# Altium integrated library RF Module.IntLib: 92 symbols (part 1 of 2) (continued)
## 10955 (continued)
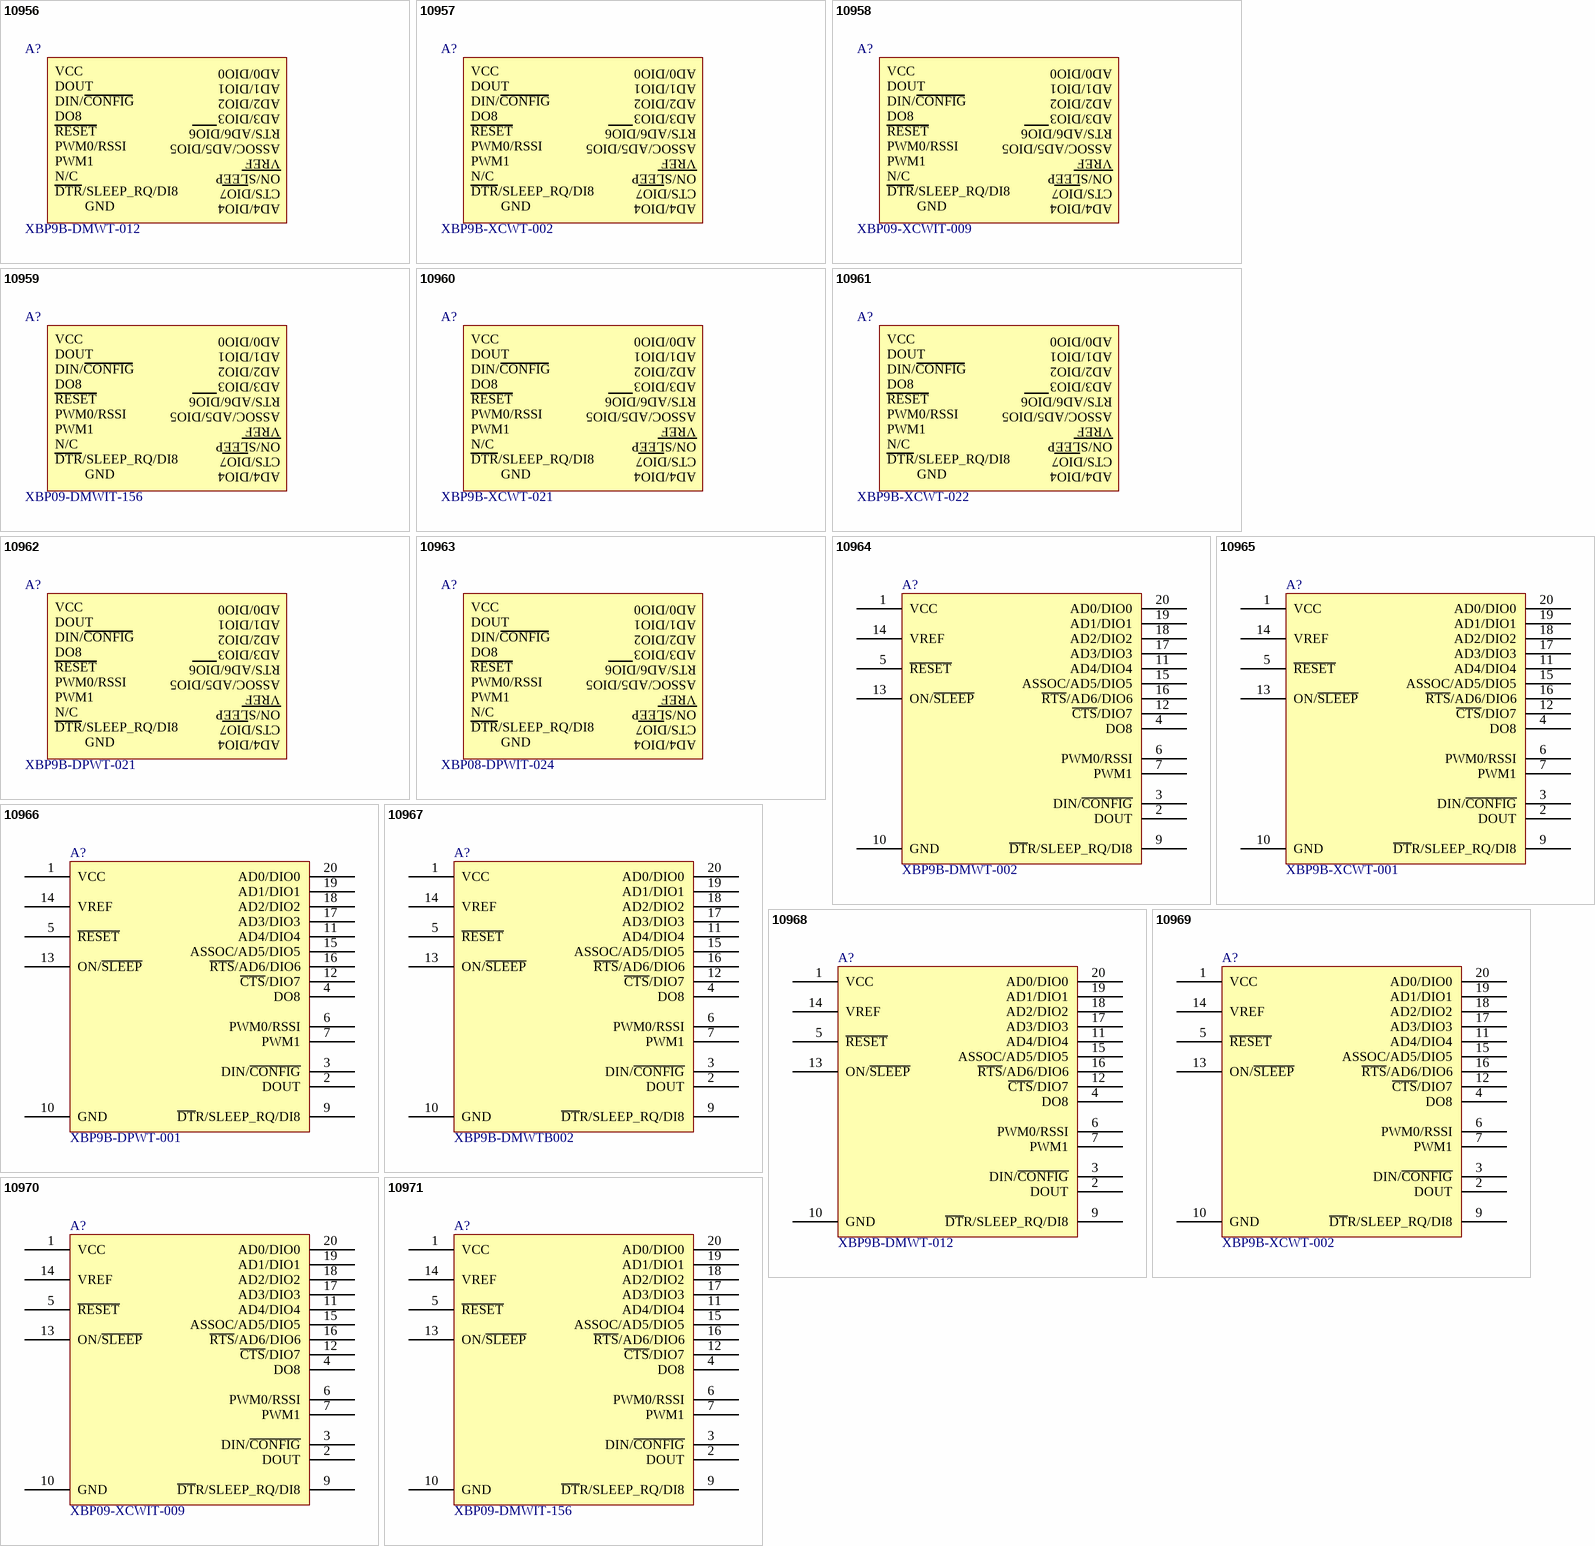
[diagram p4: symbols 10956 to 10971]
text: AD0/DIO0; VCC; AD1/DIO1; DOUT; AD2/DIO2; DIN/CONFIG; AD3/DIO3; DO8; RTS/AD6/DIO6; RESET; ASSOC/AD5/DIO5; PWM0/RSSI; VREF; PWM1; ON/SLEEP; N/C; CTS/DIO7; DTR/SLEEP_RQ/DI8; AD4/DIO4; GND

## 10956
designator A?, comment XBP9B-DMWT-012
XBEE PRO DIGIMESH S3B 900HP WIRE; Manufacturer: Digi International; RF Family/Standard: General ISM &lt; 1GHz; Modulation: FHSS; Frequency: 902MHz ~ 928MHz; DataRate: 200kbps; Power - Output: 24dBm; Sensitivity: -101dBm; Serial Interfaces: SPI, UART; Antenna Type: Integrated, Wire Antenna; Voltage - Supply: 2.1 V ~ 3.6 V; Current - Receiving: 29mA; Current - Transmitting: 215mA; PartId: 10956; Part Number: XBP9B-DMWT-012; Supplier 1: Digi-Key; Supplier Part Number 1: 602-1306-ND; ComponentLink1Description: Datasheet; ComponentLink1URL: http://www.digi.com/pdf/ds_xbeepro900hp.pdf; ComponentLink2Description: Digi-Key Listing; ComponentLink2URL: https://www.digikey.com/product-detail/en/digi-international/XBP9B-DMWT-012/602-1306-ND/3911192; Price: 54.41; Device Package: Module; Operating Temperature: -40C ~ 85C; Mounting Type: Through Hole
footprint DIGI XBEE PRO WIRE 900 FOR HDR
text: AD0/DIO0; VCC; AD1/DIO1; DOUT; AD2/DIO2; DIN/CONFIG; AD3/DIO3; DO8; RTS/AD6/DIO6; RESET; ASSOC/AD5/DIO5; PWM0/RSSI; VREF; PWM1; ON/SLEEP; N/C; CTS/DIO7; DTR/SLEEP_RQ/DI8; AD4/DIO4; GND

## 10957
designator A?, comment XBP9B-XCWT-002
XBEE PRO XSC S3B 900MHZ 250MW; Manufacturer: Digi International; RF Family/Standard: General ISM &lt; 1GHz; Modulation: FHSS; Frequency: 902MHz ~ 928MHz; DataRate: 20kbps; Power - Output: 24dBm; Sensitivity: -107dBm; Serial Interfaces: SPI, UART; Antenna Type: Integrated, Wire Antenna; Voltage - Supply: 2.4 V ~ 3.6 V; Current - Receiving: 26mA; Current - Transmitting: 215mA; PartId: 10957; Part Number: XBP9B-XCWT-002; Supplier 1: Digi-Key; Supplier Part Number 1: 602-1298-ND; ComponentLink1Description: Datasheet; ComponentLink1URL: http://www.digi.com/pdf/ds_xbeeproxsc.pdf; ComponentLink2Description: Digi-Key Listing; ComponentLink2URL: https://www.digikey.com/product-detail/en/digi-international/XBP9B-XCWT-002/602-1298-ND/3482825; Price: 54.41; Device Package: Module; Operating Temperature: -40C ~ 85C; Mounting Type: Through Hole
footprint DIGI XBEE PRO WIRE 900 FOR HDR
text: AD0/DIO0; VCC; AD1/DIO1; DOUT; AD2/DIO2; DIN/CONFIG; AD3/DIO3; DO8; RTS/AD6/DIO6; RESET; ASSOC/AD5/DIO5; PWM0/RSSI; VREF; PWM1; ON/SLEEP; N/C; CTS/DIO7; DTR/SLEEP_RQ/DI8; AD4/DIO4; GND

## 10958
designator A?, comment XBP09-XCWIT-009
XBEE-PRO XSC -100MW 9.6KBPS; Manufacturer: Digi International; RF Family/Standard: General ISM &lt; 1GHz; Modulation: FHSS; Frequency: 900MHz; DataRate: 10kbps; Power - Output: 20dBm; Sensitivity: -106dBm; Serial Interfaces: UART; Antenna Type: Integrated, Wire Antenna; Voltage - Supply: 3 V ~ 3.6 V; Current - Receiving: 65mA; Current - Transmitting: 265mA; PartId: 10958; Part Number: XBP09-XCWIT-009; Supplier 1: Digi-Key; Supplier Part Number 1: 602-1279-ND; ComponentLink1Description: Datasheet; ComponentLink1URL: http://www.digi.com/pdf/ds_xbeeproxsc.pdf; ComponentLink2Description: Digi-Key Listing; ComponentLink2URL: https://www.digikey.com/product-detail/en/digi-international/XBP09-XCWIT-009/602-1279-ND/3079625; Price: 54.41; Device Package: Module; Operating Temperature: -40C ~ 85C; Mounting Type: Through Hole
footprint DIGI XBEE PRO WIRE 900 FOR HDR
text: AD0/DIO0; VCC; AD1/DIO1; DOUT; AD2/DIO2; DIN/CONFIG; AD3/DIO3; DO8; RTS/AD6/DIO6; RESET; ASSOC/AD5/DIO5; PWM0/RSSI; VREF; PWM1; ON/SLEEP; N/C; CTS/DIO7; DTR/SLEEP_RQ/DI8; AD4/DIO4; GND

## 10959
designator A?, comment XBP09-DMWIT-156
XBEE PRO DIGIMESH 900MHZ WIRE; Manufacturer: Digi International; Protocol: Zigbee; DataRate: 156kbps; Power - Output: 17dBm; Sensitivity: -100dBm; Antenna Type: Integrated, Wire Antenna; Voltage - Supply: 3 V ~ 3.6 V; Current - Receiving: 80mA; Current - Transmitting: 210mA; PartId: 10959; Part Number: XBP09-DMWIT-156; Supplier 1: Digi-Key; Supplier Part Number 1: 602-1277-ND; ComponentLink1Description: Datasheet; ComponentLink1URL: http://ftp1.digi.com/support/documentation/90000903_G.pdf; ComponentLink2Description: Digi-Key Listing; ComponentLink2URL: https://www.digikey.com/product-detail/en/digi-international/XBP09-DMWIT-156/602-1277-ND/3482661; Price: 54.41; Device Package: Module; Operating Temperature: -40C ~ 85C; RF Family/Standard: 802.15.4; Frequency: 900MHz; Mounting Type: Through Hole
footprint DIGI XBEE PRO WIRE 900 FOR HDR
text: AD0/DIO0; VCC; AD1/DIO1; DOUT; AD2/DIO2; DIN/CONFIG; AD3/DIO3; DO8; RTS/AD6/DIO6; RESET; ASSOC/AD5/DIO5; PWM0/RSSI; VREF; PWM1; ON/SLEEP; N/C; CTS/DIO7; DTR/SLEEP_RQ/DI8; AD4/DIO4; GND

## 10960
designator A?, comment XBP9B-XCWT-021
XBEE PRO XSC S3B 900MHZ 250MW; Manufacturer: Digi International; RF Family/Standard: General ISM &lt; 1GHz; Modulation: FHSS; Frequency: 902MHz ~ 928MHz; DataRate: 10kbps; Power - Output: 24dBm; Sensitivity: -109dBm; Serial Interfaces: SPI, UART; Antenna Type: Integrated, Wire Antenna; Voltage - Supply: 2.4 V ~ 3.6 V; Current - Receiving: 26mA; Current - Transmitting: 215mA; PartId: 10960; Part Number: XBP9B-XCWT-021; Supplier 1: Digi-Key; Supplier Part Number 1: 602-1356-ND; ComponentLink1Description: Datasheet; ComponentLink1URL: http://www.digi.com/pdf/ds_xbeeproxsc.pdf; ComponentLink2Description: Digi-Key Listing; ComponentLink2URL: https://www.digikey.com/product-detail/en/digi-international/XBP9B-XCWT-021/602-1356-ND/3482826; Price: 54.41; Device Package: Module; Operating Temperature: -40C ~ 85C; Mounting Type: Through Hole
footprint DIGI XBEE PRO WIRE 900 FOR HDR
text: AD0/DIO0; VCC; AD1/DIO1; DOUT; AD2/DIO2; DIN/CONFIG; AD3/DIO3; DO8; RTS/AD6/DIO6; RESET; ASSOC/AD5/DIO5; PWM0/RSSI; VREF; PWM1; ON/SLEEP; N/C; CTS/DIO7; DTR/SLEEP_RQ/DI8; AD4/DIO4; GND

## 10961
designator A?, comment XBP9B-XCWT-022
XBEE PRO XSC S3B 900MHZ 250MW; Manufacturer: Digi International; RF Family/Standard: General ISM &lt; 1GHz; Modulation: FHSS; Frequency: 902MHz ~ 928MHz; DataRate: 10kbps; Power - Output: 24dBm; Sensitivity: -107dBm; Serial Interfaces: SPI, UART; Antenna Type: Integrated, Wire Antenna; Voltage - Supply: 2.4 V ~ 3.6 V; Current - Receiving: 26mA; Current - Transmitting: 215mA; PartId: 10961; Part Number: XBP9B-XCWT-022; Supplier 1: Digi-Key; Supplier Part Number 1: 602-1357-ND; ComponentLink1Description: Datasheet; ComponentLink1URL: http://www.digi.com/pdf/ds_xbeeproxsc.pdf; ComponentLink2Description: Digi-Key Listing; ComponentLink2URL: https://www.digikey.com/product-detail/en/digi-international/XBP9B-XCWT-022/602-1357-ND/3482827; Price: 54.41; Device Package: Module; Operating Temperature: -40C ~ 85C; Mounting Type: Through Hole
footprint DIGI XBEE PRO WIRE 900 FOR HDR
text: AD0/DIO0; VCC; AD1/DIO1; DOUT; AD2/DIO2; DIN/CONFIG; AD3/DIO3; DO8; RTS/AD6/DIO6; RESET; ASSOC/AD5/DIO5; PWM0/RSSI; VREF; PWM1; ON/SLEEP; N/C; CTS/DIO7; DTR/SLEEP_RQ/DI8; AD4/DIO4; GND

## 10962
designator A?, comment XBP9B-DPWT-021
XBEE PRO WIRE ANT 250MW 10KBPS; Manufacturer: Digi International; RF Family/Standard: General ISM &lt; 1GHz; Modulation: FHSS; Frequency: 902MHz ~ 928MHz; Power - Output: 24dBm; Sensitivity: -110dBm; Serial Interfaces: SPI, UART; Antenna Type: Integrated, Wire Antenna; Voltage - Supply: 2.1 V ~ 3.6 V; Current - Receiving: 29mA; Current - Transmitting: 215mA; PartId: 10962; Part Number: XBP9B-DPWT-021; Supplier 1: Digi-Key; Supplier Part Number 1: 602-1489-ND; ComponentLink1Description: Datasheet; ComponentLink1URL: http://www.digi.com/pdf/ds_xbeepro900hp.pdf; ComponentLink2Description: Digi-Key Listing; ComponentLink2URL: https://www.digikey.com/product-detail/en/digi-international/XBP9B-DPWT-021/602-1489-ND/3728687; Price: 54.41; Device Package: Module; Operating Temperature: -40C ~ 85C; DataRate: 10kbps; Mounting Type: Through Hole
footprint DIGI XBEE PRO WIRE 900 FOR HDR
text: AD0/DIO0; VCC; AD1/DIO1; DOUT; AD2/DIO2; DIN/CONFIG; AD3/DIO3; DO8; RTS/AD6/DIO6; RESET; ASSOC/AD5/DIO5; PWM0/RSSI; VREF; PWM1; ON/SLEEP; N/C; CTS/DIO7; DTR/SLEEP_RQ/DI8; AD4/DIO4; GND

## 10963
designator A?, comment XBP08-DPWIT-024
XBEE PRO 868MHZ 1-315MW WIRE EU; Manufacturer: Digi International; Protocol: Zigbee; DataRate: 24kbps; Power - Output: 25dBm; Sensitivity: -112dBm; Antenna Type: Integrated, Wire Antenna; Voltage - Supply: 3 V ~ 3.6 V; Current - Receiving: 65mA; Current - Transmitting: 500mA; PartId: 10963; Part Number: XBP08-DPWIT-024; Supplier 1: Digi-Key; Supplier Part Number 1: 602-1475-ND; ComponentLink1Description: Datasheet; ComponentLink1URL: http://www.digi.com/pdf/ds_xbeepro868.pdf; ComponentLink2Description: Digi-Key Listing; ComponentLink2URL: https://www.digikey.com/product-detail/en/digi-international/XBP08-DPWIT-024/602-1475-ND/3482658; Price: 62.78; Device Package: Module; Operating Temperature: -40C ~ 85C; RF Family/Standard: 802.15.4; Frequency: 868MHz; Mounting Type: Through Hole
footprint DIGI XBEE PRO WIRE 900 FOR HDR
text: AD0/DIO0; VCC; AD1/DIO1; DOUT; AD2/DIO2; DIN/CONFIG; AD3/DIO3; DO8; RTS/AD6/DIO6; RESET; ASSOC/AD5/DIO5; PWM0/RSSI; VREF; PWM1; ON/SLEEP; N/C; CTS/DIO7; DTR/SLEEP_RQ/DI8; AD4/DIO4; GND

## 10964
designator A?, comment XBP9B-DMWT-002
MODULE XBEE PRO S3B 900HP WR ANT; Manufacturer: Digi International; RF Family/Standard: General ISM &lt; 1GHz; Modulation: FHSS; Frequency: 900MHz; DataRate: 200kbps; Power - Output: 24dBm; Sensitivity: -101dBm; Serial Interfaces: SPI, UART; Antenna Type: Integrated, Wire Antenna; Voltage - Supply: 2.1 V ~ 3.6 V; Current - Receiving: 29mA; Current - Transmitting: 215mA; PartId: 10964; Part Number: XBP9B-DMWT-002; Supplier 1: Digi-Key; Supplier Part Number 1: 602-1301-ND; ComponentLink1Description: Datasheet; ComponentLink1URL: http://www.digi.com/pdf/ds_xbeepro900hp.pdf; ComponentLink2Description: Digi-Key Listing; ComponentLink2URL: https://www.digikey.com/product-detail/en/digi-international/XBP9B-DMWT-002/602-1301-ND/3594159; Price: 54.41; Device Package: Module; Operating Temperature: -40C ~ 85C; Mounting Type: Through Hole
footprint DIGI XBEE PRO WIRE 900
pins: 1 VCC, 2 DOUT, 3 DIN/~{CONFIG}, 4 DO8, 5 ~{RESET}, 6 PWM0/RSSI, 7 PWM1, 9 ~{DT}R/SLEEP_RQ/DI8, 10 GND, 11 AD4/DIO4, 12 ~{CTS}/DIO7, 13 ON/~{SLEEP}, 14 VREF, 15 ASSOC/AD5/DIO5, 16 ~{RTS}/AD6/DIO6, 17 AD3/DIO3, 18 AD2/DIO2, 19 AD1/DIO1, 20 AD0/DIO0

## 10965
designator A?, comment XBP9B-XCWT-001
XBEE PRO XSC S3B 900MHZ 250MW; Manufacturer: Digi International; RF Family/Standard: General ISM &lt; 1GHz; Modulation: FHSS; Frequency: 902MHz ~ 928MHz; DataRate: 10kbps; Power - Output: 24dBm; Sensitivity: -109dBm; Serial Interfaces: SPI, UART; Antenna Type: Integrated, Wire Antenna; Voltage - Supply: 2.4 V ~ 3.6 V; Current - Receiving: 26mA; Current - Transmitting: 215mA; PartId: 10965; Part Number: XBP9B-XCWT-001; Supplier 1: Digi-Key; Supplier Part Number 1: 602-1297-ND; ComponentLink1Description: Datasheet; ComponentLink1URL: http://www.digi.com/pdf/ds_xbeeproxsc.pdf; ComponentLink2Description: Digi-Key Listing; ComponentLink2URL: https://www.digikey.com/product-detail/en/digi-international/XBP9B-XCWT-001/602-1297-ND/3482824; Price: 54.41; Device Package: Module; Operating Temperature: -40C ~ 85C; Mounting Type: Through Hole
footprint DIGI XBEE PRO WIRE 900
pins: 1 VCC, 2 DOUT, 3 DIN/~{CONFIG}, 4 DO8, 5 ~{RESET}, 6 PWM0/RSSI, 7 PWM1, 9 ~{DT}R/SLEEP_RQ/DI8, 10 GND, 11 AD4/DIO4, 12 ~{CTS}/DIO7, 13 ON/~{SLEEP}, 14 VREF, 15 ASSOC/AD5/DIO5, 16 ~{RTS}/AD6/DIO6, 17 AD3/DIO3, 18 AD2/DIO2, 19 AD1/DIO1, 20 AD0/DIO0

## 10966
designator A?, comment XBP9B-DPWT-001
MODULE XBEE PRO S3B 900HP WR ANT; Manufacturer: Digi International; RF Family/Standard: General ISM &lt; 1GHz; Modulation: FHSS; Frequency: 902MHz ~ 928MHz; DataRate: 10kbps; Power - Output: 24dBm; Sensitivity: -110dBm; Serial Interfaces: SPI, UART; Antenna Type: Integrated, Wire Antenna; Voltage - Supply: 2.1 V ~ 3.6 V; Current - Receiving: 29mA; Current - Transmitting: 215mA; PartId: 10966; Part Number: XBP9B-DPWT-001; Supplier 1: Digi-Key; Supplier Part Number 1: 602-1351-ND; ComponentLink1Description: Datasheet; ComponentLink1URL: http://www.digi.com/pdf/ds_xbeepro900hp.pdf; ComponentLink2Description: Digi-Key Listing; ComponentLink2URL: https://www.digikey.com/product-detail/en/digi-international/XBP9B-DPWT-001/602-1351-ND/3594162; Price: 54.41; Device Package: Module; Operating Temperature: -40C ~ 85C; Mounting Type: Through Hole
footprint DIGI XBEE PRO WIRE 900
pins: 1 VCC, 2 DOUT, 3 DIN/~{CONFIG}, 4 DO8, 5 ~{RESET}, 6 PWM0/RSSI, 7 PWM1, 9 ~{DT}R/SLEEP_RQ/DI8, 10 GND, 11 AD4/DIO4, 12 ~{CTS}/DIO7, 13 ON/~{SLEEP}, 14 VREF, 15 ASSOC/AD5/DIO5, 16 ~{RTS}/AD6/DIO6, 17 AD3/DIO3, 18 AD2/DIO2, 19 AD1/DIO1, 20 AD0/DIO0

## 10967
designator A?, comment XBP9B-DMWTB002
XBEE PRO DIGIMESH S3B 900HP WIRE; Manufacturer: Digi International; RF Family/Standard: General ISM &lt; 1GHz; Modulation: FHSS; Frequency: 900MHz; DataRate: 200kbps; Power - Output: 24dBm; Sensitivity: -101dBm; Serial Interfaces: SPI, UART; Antenna Type: Integrated, Wire Antenna; Memory Size: 32kB Flash, 2kB RAM; Voltage - Supply: 2.1 V ~ 3.6 V; Current - Receiving: 29mA; Current - Transmitting: 215mA; PartId: 10967; Part Number: XBP9B-DMWTB002; Supplier 1: Digi-Key; Supplier Part Number 1: 602-1348-ND; ComponentLink1Description: Datasheet; ComponentLink1URL: http://www.digi.com/pdf/ds_xbeepro900hp.pdf; ComponentLink2Description: Digi-Key Listing; ComponentLink2URL: https://www.digikey.com/product-detail/en/digi-international/XBP9B-DMWTB002/602-1348-ND/3863552; Price: 58.25; Device Package: Module; Operating Temperature: -40C ~ 85C; Mounting Type: Through Hole
footprint DIGI XBEE PRO WIRE 900
pins: 1 VCC, 2 DOUT, 3 DIN/~{CONFIG}, 4 DO8, 5 ~{RESET}, 6 PWM0/RSSI, 7 PWM1, 9 ~{DT}R/SLEEP_RQ/DI8, 10 GND, 11 AD4/DIO4, 12 ~{CTS}/DIO7, 13 ON/~{SLEEP}, 14 VREF, 15 ASSOC/AD5/DIO5, 16 ~{RTS}/AD6/DIO6, 17 AD3/DIO3, 18 AD2/DIO2, 19 AD1/DIO1, 20 AD0/DIO0

## 10968
designator A?, comment XBP9B-DMWT-012
XBEE PRO DIGIMESH S3B 900HP WIRE; Manufacturer: Digi International; RF Family/Standard: General ISM &lt; 1GHz; Modulation: FHSS; Frequency: 902MHz ~ 928MHz; DataRate: 200kbps; Power - Output: 24dBm; Sensitivity: -101dBm; Serial Interfaces: SPI, UART; Antenna Type: Integrated, Wire Antenna; Voltage - Supply: 2.1 V ~ 3.6 V; Current - Receiving: 29mA; Current - Transmitting: 215mA; PartId: 10968; Part Number: XBP9B-DMWT-012; Supplier 1: Digi-Key; Supplier Part Number 1: 602-1306-ND; ComponentLink1Description: Datasheet; ComponentLink1URL: http://www.digi.com/pdf/ds_xbeepro900hp.pdf; ComponentLink2Description: Digi-Key Listing; ComponentLink2URL: https://www.digikey.com/product-detail/en/digi-international/XBP9B-DMWT-012/602-1306-ND/3911192; Price: 54.41; Device Package: Module; Operating Temperature: -40C ~ 85C; Mounting Type: Through Hole
footprint DIGI XBEE PRO WIRE 900
pins: 1 VCC, 2 DOUT, 3 DIN/~{CONFIG}, 4 DO8, 5 ~{RESET}, 6 PWM0/RSSI, 7 PWM1, 9 ~{DT}R/SLEEP_RQ/DI8, 10 GND, 11 AD4/DIO4, 12 ~{CTS}/DIO7, 13 ON/~{SLEEP}, 14 VREF, 15 ASSOC/AD5/DIO5, 16 ~{RTS}/AD6/DIO6, 17 AD3/DIO3, 18 AD2/DIO2, 19 AD1/DIO1, 20 AD0/DIO0

## 10969
designator A?, comment XBP9B-XCWT-002
XBEE PRO XSC S3B 900MHZ 250MW; Manufacturer: Digi International; RF Family/Standard: General ISM &lt; 1GHz; Modulation: FHSS; Frequency: 902MHz ~ 928MHz; DataRate: 20kbps; Power - Output: 24dBm; Sensitivity: -107dBm; Serial Interfaces: SPI, UART; Antenna Type: Integrated, Wire Antenna; Voltage - Supply: 2.4 V ~ 3.6 V; Current - Receiving: 26mA; Current - Transmitting: 215mA; PartId: 10969; Part Number: XBP9B-XCWT-002; Supplier 1: Digi-Key; Supplier Part Number 1: 602-1298-ND; ComponentLink1Description: Datasheet; ComponentLink1URL: http://www.digi.com/pdf/ds_xbeeproxsc.pdf; ComponentLink2Description: Digi-Key Listing; ComponentLink2URL: https://www.digikey.com/product-detail/en/digi-international/XBP9B-XCWT-002/602-1298-ND/3482825; Price: 54.41; Device Package: Module; Operating Temperature: -40C ~ 85C; Mounting Type: Through Hole
footprint DIGI XBEE PRO WIRE 900
pins: 1 VCC, 2 DOUT, 3 DIN/~{CONFIG}, 4 DO8, 5 ~{RESET}, 6 PWM0/RSSI, 7 PWM1, 9 ~{DT}R/SLEEP_RQ/DI8, 10 GND, 11 AD4/DIO4, 12 ~{CTS}/DIO7, 13 ON/~{SLEEP}, 14 VREF, 15 ASSOC/AD5/DIO5, 16 ~{RTS}/AD6/DIO6, 17 AD3/DIO3, 18 AD2/DIO2, 19 AD1/DIO1, 20 AD0/DIO0

## 10970
designator A?, comment XBP09-XCWIT-009
XBEE-PRO XSC -100MW 9.6KBPS; Manufacturer: Digi International; RF Family/Standard: General ISM &lt; 1GHz; Modulation: FHSS; Frequency: 900MHz; DataRate: 10kbps; Power - Output: 20dBm; Sensitivity: -106dBm; Serial Interfaces: UART; Antenna Type: Integrated, Wire Antenna; Voltage - Supply: 3 V ~ 3.6 V; Current - Receiving: 65mA; Current - Transmitting: 265mA; PartId: 10970; Part Number: XBP09-XCWIT-009; Supplier 1: Digi-Key; Supplier Part Number 1: 602-1279-ND; ComponentLink1Description: Datasheet; ComponentLink1URL: http://www.digi.com/pdf/ds_xbeeproxsc.pdf; ComponentLink2Description: Digi-Key Listing; ComponentLink2URL: https://www.digikey.com/product-detail/en/digi-international/XBP09-XCWIT-009/602-1279-ND/3079625; Price: 54.41; Device Package: Module; Operating Temperature: -40C ~ 85C; Mounting Type: Through Hole
footprint DIGI XBEE PRO WIRE 900
pins: 1 VCC, 2 DOUT, 3 DIN/~{CONFIG}, 4 DO8, 5 ~{RESET}, 6 PWM0/RSSI, 7 PWM1, 9 ~{DT}R/SLEEP_RQ/DI8, 10 GND, 11 AD4/DIO4, 12 ~{CTS}/DIO7, 13 ON/~{SLEEP}, 14 VREF, 15 ASSOC/AD5/DIO5, 16 ~{RTS}/AD6/DIO6, 17 AD3/DIO3, 18 AD2/DIO2, 19 AD1/DIO1, 20 AD0/DIO0

## 10971
designator A?, comment XBP09-DMWIT-156
XBEE PRO DIGIMESH 900MHZ WIRE; Manufacturer: Digi International; Protocol: Zigbee; DataRate: 156kbps; Power - Output: 17dBm; Sensitivity: -100dBm; Antenna Type: Integrated, Wire Antenna; Voltage - Supply: 3 V ~ 3.6 V; Current - Receiving: 80mA; Current - Transmitting: 210mA; PartId: 10971; Part Number: XBP09-DMWIT-156; Supplier 1: Digi-Key; Supplier Part Number 1: 602-1277-ND; ComponentLink1Description: Datasheet; ComponentLink1URL: http://ftp1.digi.com/support/documentation/90000903_G.pdf; ComponentLink2Description: Digi-Key Listing; ComponentLink2URL: https://www.digikey.com/product-detail/en/digi-international/XBP09-DMWIT-156/602-1277-ND/3482661; Price: 54.41; Device Package: Module; Operating Temperature: -40C ~ 85C; RF Family/Standard: 802.15.4; Frequency: 900MHz; Mounting Type: Through Hole
footprint DIGI XBEE PRO WIRE 900
pins: 1 VCC, 2 DOUT, 3 DIN/~{CONFIG}, 4 DO8, 5 ~{RESET}, 6 PWM0/RSSI, 7 PWM1, 9 ~{DT}R/SLEEP_RQ/DI8, 10 GND, 11 AD4/DIO4, 12 ~{CTS}/DIO7, 13 ON/~{SLEEP}, 14 VREF, 15 ASSOC/AD5/DIO5, 16 ~{RTS}/AD6/DIO6, 17 AD3/DIO3, 18 AD2/DIO2, 19 AD1/DIO1, 20 AD0/DIO0

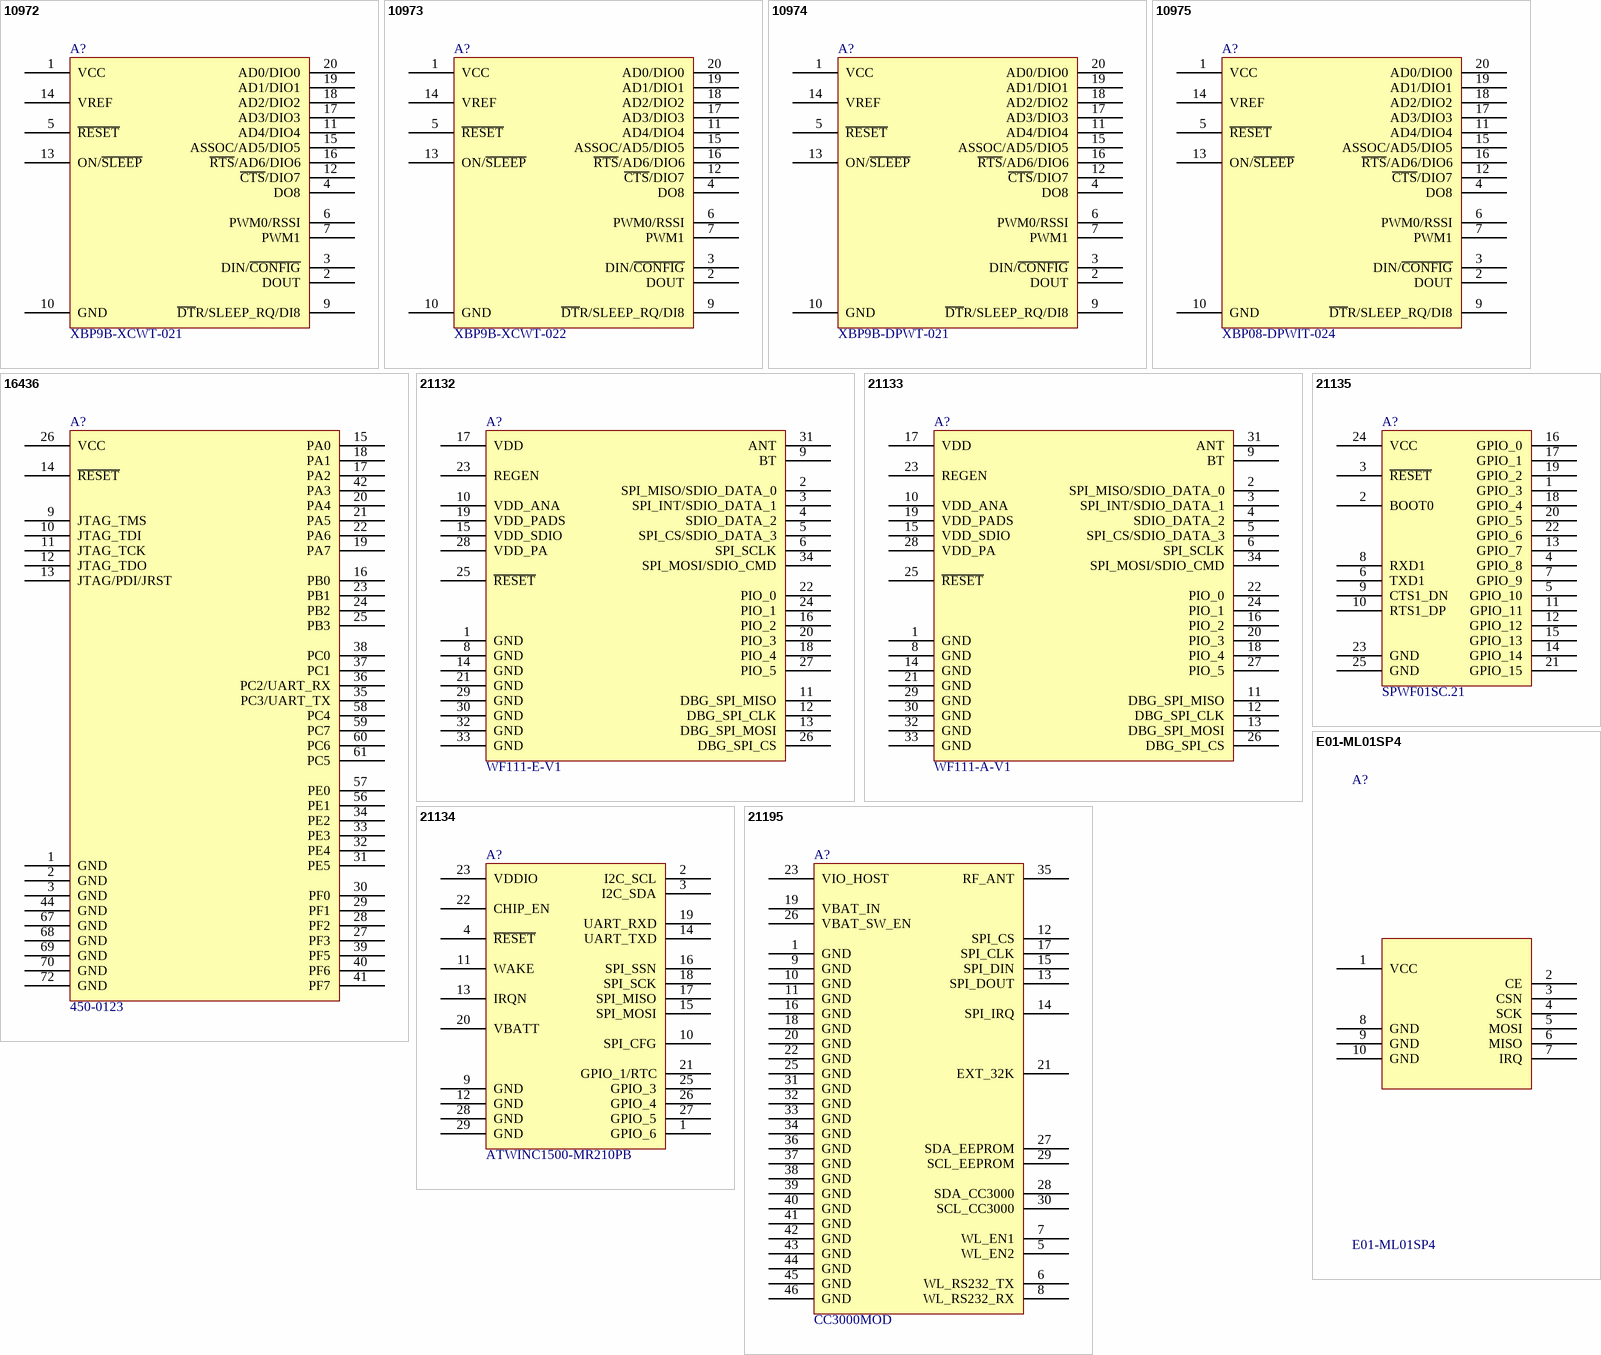
[diagram p5: symbols 10972 to E01-ML01SP4]

## 10972
designator A?, comment XBP9B-XCWT-021
XBEE PRO XSC S3B 900MHZ 250MW; Manufacturer: Digi International; RF Family/Standard: General ISM &lt; 1GHz; Modulation: FHSS; Frequency: 902MHz ~ 928MHz; DataRate: 10kbps; Power - Output: 24dBm; Sensitivity: -109dBm; Serial Interfaces: SPI, UART; Antenna Type: Integrated, Wire Antenna; Voltage - Supply: 2.4 V ~ 3.6 V; Current - Receiving: 26mA; Current - Transmitting: 215mA; PartId: 10972; Part Number: XBP9B-XCWT-021; Supplier 1: Digi-Key; Supplier Part Number 1: 602-1356-ND; ComponentLink1Description: Datasheet; ComponentLink1URL: http://www.digi.com/pdf/ds_xbeeproxsc.pdf; ComponentLink2Description: Digi-Key Listing; ComponentLink2URL: https://www.digikey.com/product-detail/en/digi-international/XBP9B-XCWT-021/602-1356-ND/3482826; Price: 54.41; Device Package: Module; Operating Temperature: -40C ~ 85C; Mounting Type: Through Hole
footprint DIGI XBEE PRO WIRE 900
pins: 1 VCC, 2 DOUT, 3 DIN/~{CONFIG}, 4 DO8, 5 ~{RESET}, 6 PWM0/RSSI, 7 PWM1, 9 ~{DT}R/SLEEP_RQ/DI8, 10 GND, 11 AD4/DIO4, 12 ~{CTS}/DIO7, 13 ON/~{SLEEP}, 14 VREF, 15 ASSOC/AD5/DIO5, 16 ~{RTS}/AD6/DIO6, 17 AD3/DIO3, 18 AD2/DIO2, 19 AD1/DIO1, 20 AD0/DIO0

## 10973
designator A?, comment XBP9B-XCWT-022
XBEE PRO XSC S3B 900MHZ 250MW; Manufacturer: Digi International; RF Family/Standard: General ISM &lt; 1GHz; Modulation: FHSS; Frequency: 902MHz ~ 928MHz; DataRate: 10kbps; Power - Output: 24dBm; Sensitivity: -107dBm; Serial Interfaces: SPI, UART; Antenna Type: Integrated, Wire Antenna; Voltage - Supply: 2.4 V ~ 3.6 V; Current - Receiving: 26mA; Current - Transmitting: 215mA; PartId: 10973; Part Number: XBP9B-XCWT-022; Supplier 1: Digi-Key; Supplier Part Number 1: 602-1357-ND; ComponentLink1Description: Datasheet; ComponentLink1URL: http://www.digi.com/pdf/ds_xbeeproxsc.pdf; ComponentLink2Description: Digi-Key Listing; ComponentLink2URL: https://www.digikey.com/product-detail/en/digi-international/XBP9B-XCWT-022/602-1357-ND/3482827; Price: 54.41; Device Package: Module; Operating Temperature: -40C ~ 85C; Mounting Type: Through Hole
footprint DIGI XBEE PRO WIRE 900
pins: 1 VCC, 2 DOUT, 3 DIN/~{CONFIG}, 4 DO8, 5 ~{RESET}, 6 PWM0/RSSI, 7 PWM1, 9 ~{DT}R/SLEEP_RQ/DI8, 10 GND, 11 AD4/DIO4, 12 ~{CTS}/DIO7, 13 ON/~{SLEEP}, 14 VREF, 15 ASSOC/AD5/DIO5, 16 ~{RTS}/AD6/DIO6, 17 AD3/DIO3, 18 AD2/DIO2, 19 AD1/DIO1, 20 AD0/DIO0

## 10974
designator A?, comment XBP9B-DPWT-021
XBEE PRO WIRE ANT 250MW 10KBPS; Manufacturer: Digi International; RF Family/Standard: General ISM &lt; 1GHz; Modulation: FHSS; Frequency: 902MHz ~ 928MHz; Power - Output: 24dBm; Sensitivity: -110dBm; Serial Interfaces: SPI, UART; Antenna Type: Integrated, Wire Antenna; Voltage - Supply: 2.1 V ~ 3.6 V; Current - Receiving: 29mA; Current - Transmitting: 215mA; PartId: 10974; Part Number: XBP9B-DPWT-021; Supplier 1: Digi-Key; Supplier Part Number 1: 602-1489-ND; ComponentLink1Description: Datasheet; ComponentLink1URL: http://www.digi.com/pdf/ds_xbeepro900hp.pdf; ComponentLink2Description: Digi-Key Listing; ComponentLink2URL: https://www.digikey.com/product-detail/en/digi-international/XBP9B-DPWT-021/602-1489-ND/3728687; Price: 54.41; Device Package: Module; Operating Temperature: -40C ~ 85C; DataRate: 10kbps; Mounting Type: Through Hole
footprint DIGI XBEE PRO WIRE 900
pins: 1 VCC, 2 DOUT, 3 DIN/~{CONFIG}, 4 DO8, 5 ~{RESET}, 6 PWM0/RSSI, 7 PWM1, 9 ~{DT}R/SLEEP_RQ/DI8, 10 GND, 11 AD4/DIO4, 12 ~{CTS}/DIO7, 13 ON/~{SLEEP}, 14 VREF, 15 ASSOC/AD5/DIO5, 16 ~{RTS}/AD6/DIO6, 17 AD3/DIO3, 18 AD2/DIO2, 19 AD1/DIO1, 20 AD0/DIO0

## 10975
designator A?, comment XBP08-DPWIT-024
XBEE PRO 868MHZ 1-315MW WIRE EU; Manufacturer: Digi International; Protocol: Zigbee; DataRate: 24kbps; Power - Output: 25dBm; Sensitivity: -112dBm; Antenna Type: Integrated, Wire Antenna; Voltage - Supply: 3 V ~ 3.6 V; Current - Receiving: 65mA; Current - Transmitting: 500mA; PartId: 10975; Part Number: XBP08-DPWIT-024; Supplier 1: Digi-Key; Supplier Part Number 1: 602-1475-ND; ComponentLink1Description: Datasheet; ComponentLink1URL: http://www.digi.com/pdf/ds_xbeepro868.pdf; ComponentLink2Description: Digi-Key Listing; ComponentLink2URL: https://www.digikey.com/product-detail/en/digi-international/XBP08-DPWIT-024/602-1475-ND/3482658; Price: 62.78; Device Package: Module; Operating Temperature: -40C ~ 85C; RF Family/Standard: 802.15.4; Frequency: 868MHz; Mounting Type: Through Hole
footprint DIGI XBEE PRO WIRE 900
pins: 1 VCC, 2 DOUT, 3 DIN/~{CONFIG}, 4 DO8, 5 ~{RESET}, 6 PWM0/RSSI, 7 PWM1, 9 ~{DT}R/SLEEP_RQ/DI8, 10 GND, 11 AD4/DIO4, 12 ~{CTS}/DIO7, 13 ON/~{SLEEP}, 14 VREF, 15 ASSOC/AD5/DIO5, 16 ~{RTS}/AD6/DIO6, 17 AD3/DIO3, 18 AD2/DIO2, 19 AD1/DIO1, 20 AD0/DIO0

## 16436
designator A?, comment 450-0123
RF TXRX MODULE 802.15.4 U.FL ANT; Manufacturer: LSR; Protocol: Zigbee; Modulation: BPSK, O-QPSK; Frequency: 900MHz; DataRate: 1Mbps; Power - Output: 24dBm; Sensitivity: -102dBm; Serial Interfaces: JTAG, SPI, UART; Antenna Type: Not Included, U.FL; Memory Size: 256kB Flash, 4kB EEPROM, 16kB RAM; Voltage - Supply: 2 V ~ 3.45 V; Current - Receiving: 30mA; Current - Transmitting: 285mA; PartId: 16436; Part Number: 450-0123; Supplier 1: Digi-Key; Supplier Part Number 1: 450-0123-ND; ComponentLink1Description: Datasheet; ComponentLink1URL: http://www.lsr.com/downloads/products/330-0152.pdf; ComponentLink2Description: Digi-Key Listing; ComponentLink2URL: http://www.digikey.com/product-detail/en/lsr/450-0123/450-0123-ND/4732750; Price: 48.63; Type: RF Transceiver Modules; Device Package: Module; Operating Temperature: -40C ~ 85C; RF Family/Standard: 802.15.4; Mounting Type: Surface Mount
footprint LSR SIFLEX02-R2 U.FL
pins: 1 GND, 2 GND, 3 GND, 9 JTAG_TMS, 10 JTAG_TDI, 11 JTAG_TCK, 12 JTAG_TDO, 13 JTAG/PDI/JRST, 14 ~{RESET}, 15 PA0, 16 PB0, 17 PA2, 18 PA1, 19 PA7, 20 PA4, 21 PA5, 22 PA6, 23 PB1, 24 PB2, 25 PB3, 26 VCC, 27 PF3, 28 PF2, 29 PF1, 30 PF0, 31 PE5, 32 PE4, 33 PE3, 34 PE2, 35 PC3/UART_TX, 36 PC2/UART_RX, 37 PC1, 38 PC0, 39 PF5, 40 PF6, 41 PF7, 42 PA3, 44 GND, 56 PE1, 57 PE0, 58 PC4, 59 PC7, 60 PC6, 61 PC5, 67 GND, 68 GND, 69 GND, 70 GND, 72 GND

## 21132
designator A?, comment WF111-E-V1
RF TXRX MODULE WIFI U.FL ANT; Manufacturer: Silicon Labs; Protocol: 802.11b/g/n; Frequency: 2.4GHz; DataRate: 72.2Mbps; Power - Output: 17dBm; Sensitivity: -97dBm; Serial Interfaces: PIO, SDIO, SPI; Antenna Type: Not Included, U.FL; Voltage - Supply: 1.7 V ~ 3.6 V; Current - Receiving: 70mA ~ 88mA; Current - Transmitting: 74mA ~ 192mA; PartId: 21132; Part Number: WF111-E-V1; Supplier 1: Digi-Key; Supplier Part Number 1: 1446-1032-ND; ComponentLink1Description: Datasheet; ComponentLink1URL: //media.digikey.com/pdf/Data%20Sheets/BlueGiga%20PDFs/WF111.pdf; ComponentLink2Description: Digi-Key Listing; ComponentLink2URL: http://www.digikey.com/product-detail/en/silicon-labs/WF111-E-V1/1446-1032-ND/4245507; Price: 10.22; Type: RF Transceiver Modules; Device Package: Module; Operating Temperature: -40C ~ 85C; RF Family/Standard: WiFi; Modulation: -; Memory Size: -; Mounting Type: Surface Mount
footprint SI LABS WF111E
pins: 1 GND, 2 SPI_MISO/SDIO_DATA_0, 3 SPI_INT/SDIO_DATA_1, 4 SDIO_DATA_2, 5 SPI_CS/SDIO_DATA_3, 6 SPI_SCLK, 8 GND, 9 BT, 10 VDD_ANA, 11 DBG_SPI_MISO, 12 DBG_SPI_CLK, 13 DBG_SPI_MOSI, 14 GND, 15 VDD_SDIO, 16 PIO_2, 17 VDD, 18 PIO_4, 19 VDD_PADS, 20 PIO_3, 21 GND, 22 PIO_0, 23 REGEN, 24 PIO_1, 25 ~{RESET}, 26 DBG_SPI_CS, 27 PIO_5, 28 VDD_PA, 29 GND, 30 GND, 31 ANT, 32 GND, 33 GND, 34 SPI_MOSI/SDIO_CMD

## 21133
designator A?, comment WF111-A-V1
RF TXRX MODULE WIFI CHIP ANT; Manufacturer: Silicon Labs; Protocol: 802.11b/g/n; Frequency: 2.4GHz; DataRate: 72.2Mbps; Power - Output: 17dBm; Sensitivity: -97dBm; Serial Interfaces: PIO, SDIO, SPI; Antenna Type: Integrated, Chip; Voltage - Supply: 1.7 V ~ 3.6 V; Current - Receiving: 88mA; Current - Transmitting: 192mA; PartId: 21133; Part Number: WF111-A-V1; Supplier 1: Digi-Key; Supplier Part Number 1: 1446-1031-ND; ComponentLink1Description: Datasheet; ComponentLink1URL: //media.digikey.com/pdf/Data%20Sheets/BlueGiga%20PDFs/WF111.pdf; ComponentLink2Description: Digi-Key Listing; ComponentLink2URL: http://www.digikey.com/product-detail/en/silicon-labs/WF111-A-V1/1446-1031-ND/4245506; Price: 10.22; Type: RF Transceiver Modules; Device Package: Module; Operating Temperature: -40C ~ 85C; RF Family/Standard: WiFi; Modulation: -; Memory Size: -; Mounting Type: Surface Mount
footprint SI LABS WF111A
pins: 1 GND, 2 SPI_MISO/SDIO_DATA_0, 3 SPI_INT/SDIO_DATA_1, 4 SDIO_DATA_2, 5 SPI_CS/SDIO_DATA_3, 6 SPI_SCLK, 8 GND, 9 BT, 10 VDD_ANA, 11 DBG_SPI_MISO, 12 DBG_SPI_CLK, 13 DBG_SPI_MOSI, 14 GND, 15 VDD_SDIO, 16 PIO_2, 17 VDD, 18 PIO_4, 19 VDD_PADS, 20 PIO_3, 21 GND, 22 PIO_0, 23 REGEN, 24 PIO_1, 25 ~{RESET}, 26 DBG_SPI_CS, 27 PIO_5, 28 VDD_PA, 29 GND, 30 GND, 31 ANT, 32 GND, 33 GND, 34 SPI_MOSI/SDIO_CMD